# Altium footprint library Footprints.PcbLib: 236 footprints (part 12 of 15)
Each footprint in its own frame and in the unit in brackets; x right, y up, seen from the top. Pads: shape width x height; smd on the part's side, far side on the other; paste and mask are expansions set on the pad; w line width, h text height; cw(c..) or ccw(c..) is an arc to the next point about the centre after c.
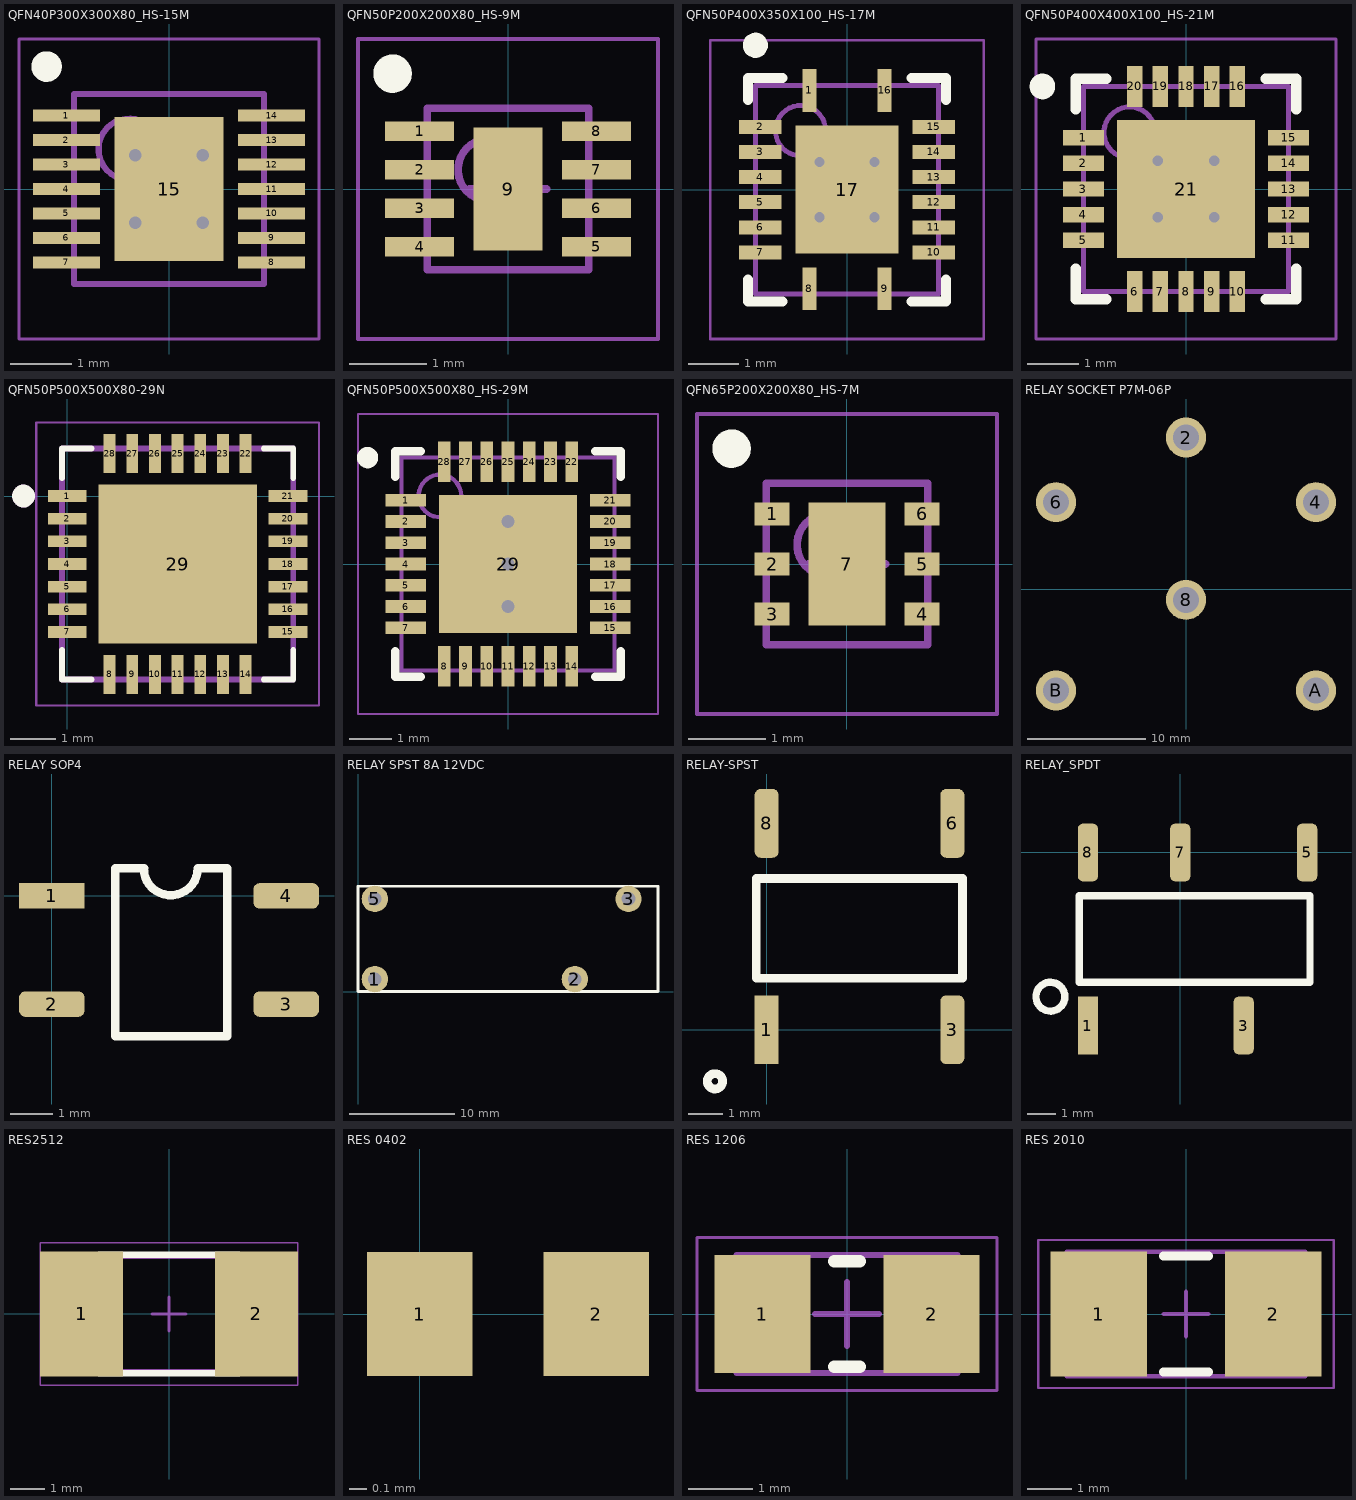
[diagram p11: the footprints below, top view; thin cyan lines are the x and y axes]

## QFN40P300X300X80_HS-15M [mm] "QFN, 14-Leads, Body 3.00x3.00mm, Pitch 0.40mm, Thermal Pad 1.78x2.35mm, IPC Low Density"
height 0.8
pads (15):
  rect 1.1x0.2 smd: 1(-1.675,1.2) 2(-1.675,0.8) 3(-1.675,0.4) 4(-1.675,0) 5(-1.675,-0.4) 6(-1.675,-0.8) 7(-1.675,-1.2) 8(1.675,-1.2) 9(1.675,-0.8) 10(1.675,-0.4) 11(1.675,0) 12(1.675,0.4) 13(1.675,0.8) 14(1.675,1.2)
  rect 1.78x2.35 smd: 15(0,0)
via 0.55,-0.55 diameter 0.5 hole 0.2
via -0.55,-0.55 diameter 0.5 hole 0.2
via 0.55,0.55 diameter 0.5 hole 0.2
via -0.55,0.55 diameter 0.5 hole 0.2
Top Overlay:
  circle w0.25: c-2,2 r0.125
Assembly Top (Mech9):
  circle w0.1: c-0.65,0.65 r0.5
  lines w0.1: -1.55,-1.55 1.55,-1.55 1.55,1.55 -1.55,1.55 -1.55,-1.55
Courtyard Top (Mech11):
  lines w0.05: -2.45,-2.45 2.45,-2.45 2.45,2.45 -2.45,2.45 -2.45,-2.45
  lines w0.1: -0.5,0 0.5,0 ; 0,-0.5 0,0.5
3D body "QFN40P300X300X80_HS-15M.step": height 0.8, standoff 0, extent -1.551,-1.55 1.551,1.55

## QFN50P200X200X80_HS-9M [mm] "QFN, 8-Leads, Body 2.00x2.00mm, Pitch 0.50mm, Thermal Pad 0.90x1.60mm, IPC Low Density"
height 0.8
pads (9):
  rect 0.9x0.25 smd: 1(-1.15,0.75) 2(-1.15,0.25) 3(-1.15,-0.25) 4(-1.15,-0.75) 5(1.15,-0.75) 6(1.15,-0.25) 7(1.15,0.25) 8(1.15,0.75)
  rect 0.9x1.6 smd: 9(0,0)
Top Overlay:
  circle w0.25: c-1.5,1.5 r0.125
Assembly Top (Mech9):
  circle w0.1: c-0.25,0.25 r0.4
  lines w0.1: -1.05,-1.05 -1.05,1.05 1.05,1.05 1.05,-1.05 -1.05,-1.05
Courtyard Top (Mech11):
  lines w0.05: -1.95,-1.95 -1.95,1.95 1.95,1.95 1.95,-1.95 -1.95,-1.95
  lines w0.1: -0.5,0 0.5,0 ; 0,-0.5 0,0.5
3D body "QFN50P200X200X80_HS-9M.step": height 0.8, standoff 0, extent -1.051,-1.05 1.051,1.05

## QFN50P400X350X100_HS-17M [mm] "QFN, 16-Leads, Body 4.00x3.50mm, Pitch 0.50mm/1.50mm, Thermal Pad 2.05x2.55mm, IPC Low Density"
height 1
pads (17):
  rect 0.28x0.85 smd: 1(-0.75,1.975) 8(-0.75,-1.975) 9(0.75,-1.975) 16(0.75,1.975)
  rect 0.85x0.28 smd: 2(-1.725,1.25) 3(-1.725,0.75) 4(-1.725,0.25) 5(-1.725,-0.25) 6(-1.725,-0.75) 7(-1.725,-1.25) 10(1.725,-1.25) 11(1.725,-0.75) 12(1.725,-0.25) 13(1.725,0.25) 14(1.725,0.75) 15(1.725,1.25)
  rect 2.05x2.55 smd: 17(0,0)
via -0.55,0.55 diameter 0.5 hole 0.2
via -0.55,-0.55 diameter 0.5 hole 0.2
via 0.55,0.55 diameter 0.5 hole 0.2
via 0.55,-0.55 diameter 0.5 hole 0.2
Top Overlay:
  circle w0.25: c-1.825,2.875 r0.125
  lines w0.2: -1.975,-1.79 -1.975,-2.225 -1.29,-2.225 ; -1.975,1.79 -1.975,2.225 -1.29,2.225 ; 1.29,-2.225 1.975,-2.225 1.975,-1.79 ; 1.29,2.225 1.975,2.225 1.975,1.79
Assembly Top (Mech9):
  circle w0.1: c-0.925,1.175 r0.5
  lines w0.1: -1.825,-2.075 -1.825,2.075 1.825,2.075 1.825,-2.075 -1.825,-2.075
Courtyard Top (Mech11):
  lines w0.05: -2.725,-2.975 -2.725,2.975 2.725,2.975 2.725,-2.975 -2.725,-2.975
  lines w0.1: -0.5,0 0.5,0 ; 0,-0.5 0,0.5
3D body "QFN50P400X350X100_HS-17M.step": height 1, standoff 0, extent -1.826,-2.076 1.826,2.076

## QFN50P400X400X100_HS-21M [mm] "QFN, 20-Leads, Body 4.00x4.00mm, Pitch 0.50mm, Thermal Pad 2.70x2.70mm, IPC Low Density"
height 1
pads (21):
  rect 0.8x0.3 smd: 1(-2,1) 2(-2,0.5) 3(-2,0) 4(-2,-0.5) 5(-2,-1) 11(2,-1) 12(2,-0.5) 13(2,0) 14(2,0.5) 15(2,1)
  rect 0.3x0.8 smd: 6(-1,-2) 7(-0.5,-2) 8(0,-2) 9(0.5,-2) 10(1,-2) 16(1,2) 17(0.5,2) 18(0,2) 19(-0.5,2) 20(-1,2)
  rect 2.7x2.7 smd: 21(0,0)
via -0.55,0.55 diameter 0.5 hole 0.2
via 0.55,0.55 diameter 0.5 hole 0.2
via -0.55,-0.55 diameter 0.5 hole 0.2
via 0.55,-0.55 diameter 0.5 hole 0.2
Top Overlay:
  circle w0.25: c-2.8,2 r0.125
  lines w0.2: -2.15,-1.55 -2.15,-2.15 -1.55,-2.15 ; -2.15,1.55 -2.15,2.15 -1.55,2.15 ; 1.55,-2.15 2.15,-2.15 2.15,-1.55 ; 1.55,2.15 2.15,2.15 2.15,1.55
Assembly Top (Mech9):
  circle w0.1: c-1.1,1.1 r0.5
  lines w0.1: -2,-2 -2,2 2,2 2,-2 -2,-2
Courtyard Top (Mech11):
  lines w0.05: -2.925,-2.925 -2.925,2.925 2.925,2.925 2.925,-2.925 -2.925,-2.925
  lines w0.1: -0.5,0 0.5,0 ; 0,-0.5 0,0.5
3D body "QFN50P400X400X100_HS-21M.step": height 1, standoff 0, extent -2.001,-2.001 2.001,2.001

## QFN50P500X500X80-29N [mm]
pads (29):
  rect 0.86x0.26 smd: 1(0,0) 2(0,-0.5) 3(0,-1) 4(0,-1.5) 5(0,-2) 6(0,-2.5) 7(0,-3) 15(4.87,-3) 16(4.87,-2.5) 17(4.87,-2) 18(4.87,-1.5) 19(4.87,-1) 20(4.87,-0.5) 21(4.87,0)
  rect 0.26x0.86 smd: 8(0.935,-3.935) 9(1.435,-3.935) 10(1.935,-3.935) 11(2.435,-3.935) 12(2.935,-3.935) 13(3.435,-3.935) 14(3.935,-3.935) 22(3.935,0.935) 23(3.435,0.935) 24(2.935,0.935) 25(2.435,0.935) 26(1.935,0.935) 27(1.435,0.935) 28(0.935,0.935)
  rect 3.5x3.5 smd: 29(2.435,-1.5)
Top Overlay:
  circle w0.3: c-0.965,0 r0.1
  lines w0.127: -0.115,-3.4 -0.115,-4.05 0.535,-4.05 ; -0.115,0.4 -0.115,1.05 0.535,1.05 ; 4.335,-4.05 4.985,-4.05 4.985,-3.4 ; 4.335,1.05 4.985,1.05 4.985,0.4
Top Paste:
  region: 2.605,-1.67 3.845,-1.67 3.845,-2.91 2.605,-2.91
  region: 1.025,-1.67 2.265,-1.67 2.265,-2.91 1.025,-2.91
  region: 1.025,-0.09 2.265,-0.09 2.265,-1.33 1.025,-1.33
  region: 2.605,-0.09 3.845,-0.09 3.845,-1.33 2.605,-1.33
Assembly Bottom:
  circle w0.3: c-0.965,0 r0.1
  circle w0.3: c-0.965,0 r0.1
  lines w0.127: -0.115,-4.05 -0.115,1.05 ; -0.115,-4.05 4.985,-4.05 ; -0.115,-4.05 -0.115,1.05 ; -0.115,-4.05 4.985,-4.05 ; -0.115,1.05 4.985,1.05 ; -0.115,1.05 4.985,1.05 ; 4.985,-4.05 4.985,1.05 ; 4.985,-4.05 4.985,1.05
Mechanical 15:
  lines w0.05: -0.685,-4.62 -0.685,1.62 5.555,1.62 5.555,-4.62 -0.685,-4.62
3D body "QFN-28-L.step": height 0.81, standoff 0, extent -0.106,-4.056 5,1.05

## QFN50P500X500X80_HS-29M [mm] "QFN, 28-Leads, Body 5.00x5.00mm, Pitch 0.50mm, Thermal Pad 3.25x3.25mm, IPC Low Density"
height 0.8
pads (29):
  rect 0.95x0.3 smd: 1(-2.4,1.5) 2(-2.4,1) 3(-2.4,0.5) 4(-2.4,0) 5(-2.4,-0.5) 6(-2.4,-1) 7(-2.4,-1.5) 15(2.4,-1.5) 16(2.4,-1) 17(2.4,-0.5) 18(2.4,0) 19(2.4,0.5) 20(2.4,1) 21(2.4,1.5)
  rect 0.3x0.95 smd: 8(-1.5,-2.4) 9(-1,-2.4) 10(-0.5,-2.4) 11(0,-2.4) 12(0.5,-2.4) 13(1,-2.4) 14(1.5,-2.4) 22(1.5,2.4) 23(1,2.4) 24(0.5,2.4) 25(0,2.4) 26(-0.5,2.4) 27(-1,2.4) 28(-1.5,2.4)
  rect 3.25x3.25 smd: 29(0,0)
via 0,-1 diameter 0.6 hole 0.3
via 0,1 diameter 0.6 hole 0.3
via 0,0 diameter 0.6 hole 0.3
Top Overlay:
  circle w0.25: c-3.3,2.5 r0.125
  lines w0.2: -2.65,-2.05 -2.65,-2.65 -2.05,-2.65 ; -2.65,2.05 -2.65,2.65 -2.05,2.65 ; 2.05,-2.65 2.65,-2.65 2.65,-2.05 ; 2.05,2.65 2.65,2.65 2.65,2.05
Assembly Top (Mech9):
  circle w0.1: c-1.6,1.6 r0.5
  lines w0.1: -2.5,-2.5 -2.5,2.5 2.5,2.5 2.5,-2.5 -2.5,-2.5
Courtyard Top (Mech11):
  lines w0.05: -3.525,-3.525 -3.525,3.525 3.525,3.525 3.525,-3.525 -3.525,-3.525
  lines w0.1: -0.5,0 0.5,0 ; 0,-0.5 0,0.5
3D body "QFN50P500X500X80_HS-29M.step": height 0.8, standoff 0, extent -2.501,-2.501 2.501,2.501

## QFN65P200X200X80_HS-7M [mm] "QFN, 6-Leads, Body 2.00x2.00mm, Pitch 0.65mm, Thermal Pad 1.00x1.60mm, IPC Low Density"
height 0.8
pads (7):
  rect 0.45x0.3 smd: 1(-0.975,0.65) 2(-0.975,0) 3(-0.975,-0.65) 4(0.975,-0.65) 5(0.975,0) 6(0.975,0.65)
  rect 1x1.6 smd: 7(0,0)
Top Overlay:
  circle w0.25: c-1.5,1.5 r0.125
Assembly Top (Mech9):
  circle w0.1: c-0.25,0.25 r0.4
  lines w0.1: -1.05,-1.05 -1.05,1.05 1.05,1.05 1.05,-1.05 -1.05,-1.05
Courtyard Top (Mech11):
  lines w0.05: -1.95,-1.95 -1.95,1.95 1.95,1.95 1.95,-1.95 -1.95,-1.95
  lines w0.1: -0.5,0 0.5,0 ; 0,-0.5 0,0.5
3D body "QFN65P200X200X80_HS-7M.step": height 0.8, standoff 0, extent -1.051,-1.05 1.051,1.05

## RELAY SOCKET P7M-06P [mm]
pads (6):
  round 3.4 hole 2.2: 2(0,12.9) 4(11.05,7.4) 6(-11.05,7.4) 8(0,-0.9) A(11.05,-8.6) B(-11.05,-8.6)
3D body: height 64, standoff 0, extent -19.5,-21.5 19.5,21.5

## RELAY SOP4 [mm]
pads (4):
  rect 1.54x0.6 smd: 1(0,0)
  rrect50% 1.54x0.6 smd: 2(0,-2.54) 3(5.5,-2.54) 4(5.5,0)
Top Overlay:
  lines w0.2: 2.155,0.65 ccw(c2.79,0.65) 3.425,0.65 ; 2.165,0.65 1.485,0.65 1.485,-3.3 4.115,-3.3 4.115,0.65 3.475,0.65
3D body "User Library-SOP-4.step": height 2.02, standoff -0.02, extent -0.73,-3.3 6.13,0.7

## RELAY SPST 8A 12VDC [mm]
pads (4):
  round 2.5 hole 1.3: 1(1.6,1.19) 2(20.6,1.19) 3(25.7,8.81) 5(1.6,8.81)
Top Overlay:
  lines w0.254: 0,0.01 28.5,0.01 28.5,10.01 0,10.01 0,0.01
3D body "G6RN_1A.x_t": height 15, standoff -3.5, extent 0,0.01 28.5,10.01

## RELAY-SPST [mm]
pads (4):
  rect 0.7x2 smd: 1(0,0)
  rrect50% 0.7x2 smd: 3(5.4,0) 6(5.4,6) 8(0,6)
Top Overlay:
  circle w0.254: c-1.5,-1.5 r0.224
  lines w0.254: -0.3,1.5 -0.3,4.4 5.7,4.4 5.7,1.5 -0.3,1.5
3D body: height 5.65, standoff 0, extent -0.299,1.501 5.699,4.399

## RELAY_SPDT [mm]
pads (5):
  rect 0.7x2 smd: 1(-3.2,-6)
  rrect50% 0.7x2 smd: 3(2.2,-6) 5(4.4,0) 7(0,0) 8(-3.2,0)
Top Overlay:
  circle w0.254: c-4.5,-5 r0.5
  lines w0.254: -3.5,-4.5 -3.5,-3.75 -3.5,-2.25 -3.5,-1.5 4.5,-1.5 4.5,-4.5 -3.5,-4.5
3D body: height 5.65, standoff 0, extent -3.499,-4.499 4.499,-1.501

## RES2512 [mm]
height 0.65
pads (2):
  rect 2.45x3.7 smd: 1(-2.575,0) 2(2.575,0)
Top Overlay:
  lines w0.2: -2.05,-1.75 2.05,-1.75 ; -2.05,1.75 2.05,1.75
Mechanical 13:
  lines w0.1: -3.175,-1.675 3.175,-1.675 3.175,1.675 -3.175,1.675 -3.175,-1.675
Mechanical 15:
  lines w0.05: -3.8,-2.1 3.8,-2.1 3.8,2.1 -3.8,2.1 -3.8,-2.1
  lines w0.1: -0.5,0 0.5,0 ; 0,-0.5 0,0.5
3D body "RES2512.step": height 0.65, standoff 0, extent -3.175,-1.675 3.175,1.675

## RES 0402 [mm]
pads (2):
  rect 0.6x0.7 smd: 1(0,0) 2(1,0)
3D body "R0402_detailed.step": height 0.32, standoff 0, extent -0.05,-0.25 1.05,0.25

## RES 1206 [mm] "Chip Resistor, 2-Leads, Body 3.20x1.60mm, IPC Medium Density"
height 0.64
pads (2):
  rect 1.5x1.85 smd: 1(-1.325,0) 2(1.325,0)
Top Overlay:
  lines w0.2: -0.2,-0.825 0.2,-0.825 ; -0.2,0.825 0.2,0.825
Mechanical 13:
  lines w0.1: -1.725,-0.925 1.725,-0.925 1.725,0.925 -1.725,0.925 -1.725,-0.925
Mechanical 15:
  lines w0.05: -2.35,-1.2 2.35,-1.2 2.35,1.2 -2.35,1.2 -2.35,-1.2
  lines w0.1: -0.5,0 0.5,0 ; 0,-0.5 0,0.5
3D body "RES 1206.step": height 0.64, standoff 0, extent -1.725,-0.925 1.725,0.925

## RES 2010 [mm] "Chip Resistor, 2-Leads, Body 5.08x2.54mm, IPC Medium Density"
height 1.04
pads (2):
  rect 2.15x2.8 smd: 1(-1.95,0) 2(1.95,0)
Top Overlay:
  lines w0.2: -0.5,-1.3 0.5,-1.3 ; -0.5,1.3 0.5,1.3
Mechanical 13:
  lines w0.1: -2.665,-1.395 2.665,-1.395 2.665,1.395 -2.665,1.395 -2.665,-1.395
Mechanical 15:
  lines w0.05: -3.3,-1.65 3.3,-1.65 3.3,1.65 -3.3,1.65 -3.3,-1.65
  lines w0.1: -0.5,0 0.5,0 ; 0,-0.5 0,0.5
3D body "RES 2010.step": height 1.04, standoff 0, extent -2.665,-1.395 2.665,1.395